# Altium footprint library DRIVER IC.PcbLib: 27 footprints (part 2 of 2)
Each footprint in its own frame and in the unit in brackets; x right, y up, seen from the top. Pads: shape width x height; smd on the part's side, far side on the other; paste and mask are expansions set on the pad; w line width, h text height; cw(c..) or ccw(c..) is an arc to the next point about the centre after c.
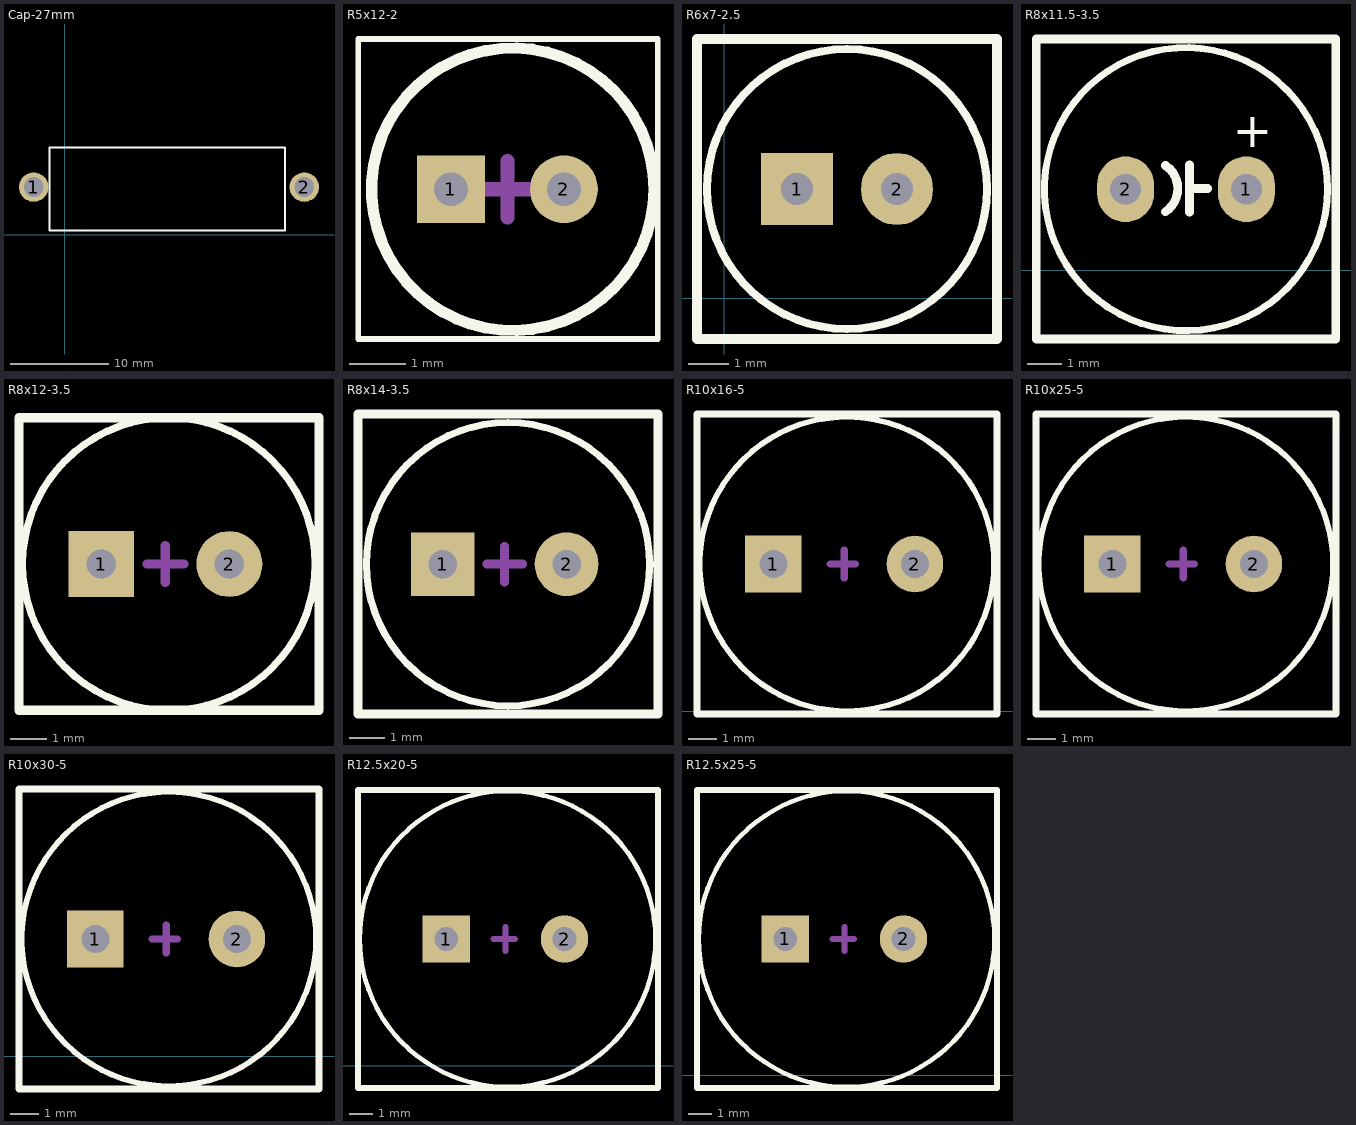
[diagram p1: the footprints below, top view; thin cyan lines are the x and y axes]

## Cap-27mm [mm]
height 16.68
pads (2):
  round 3 hole 2: 1(-3.141,4.874) 2(24.439,4.874)
Top Overlay:
  lines w0.2: -1.541,0.444 -1.541,8.904 22.459,8.904 22.459,0.444 -1.541,0.444
3D body "User Library-Vishay_1uF-400V_MKT_373_STD_27_5pitch.STEP": height 23, standoff -3, extent -4.851,-1.636 26.149,11.364

## R5x12-2 [mm]
height 12
pads (2):
  rect 1.2x1.2 hole 0.6: 1(6.237,4.773)
  round 1.2 hole 0.6: 2(8.237,4.773)
Top Overlay:
  circle w0.2: c7.333,4.773 r2.5
  lines w0.1: 4.597,2.123 4.597,7.433 9.897,7.433 9.897,2.123 4.597,2.123
Mechanical 15:
  lines w0.254: 6.737,4.773 7.737,4.773 ; 7.237,4.273 7.237,5.273
3D body "User Library-CAP-EL5X12_R100_D200_H460.STEP": height 12.2, standoff -2.9, extent 4.697,2.235 9.777,7.311

## R6x7-2.5 [mm]
height 7
pads (2):
  rect 1.8x1.8 hole 0.8: 1(1.818,2.729)
  round 1.8 hole 0.8: 2(4.318,2.729)
Top Overlay:
  circle w0.2: c3.068,2.729 r3.5
  lines w0.254: -0.682,-1.021 -0.682,6.479 6.818,6.479 6.818,-1.021 -0.682,-1.021
3D body "User Library-Cap electrolitic radial 6x7.STEP": height 7.3, standoff -1.2, extent 0.069,-0.27 6.067,5.727

## R8x11.5-3.5 [mil]
pads (2):
  oval 65x75 hole 35: 1(264.13,92.68) 2(126.34,92.68)
Top Overlay:
  circle w7.87: c195.24,92.68 r161.42
  lines w10: 171.6,66.88 ccw(c154.37,93.36) 171.75,119.73 ; 199.17,66.3 199.17,120.63 ; 199.17,93.46 220.04,93.46 ; 24.37,-78.19 24.37,263.94 366.1,263.94 366.1,-78.19 24.37,-78.19
  text "+" at 248.78,140.71 h39.37
3D body "SW3dPS-Cap electro 8x11.5x3.5mm_V2008.STEP": height 473.44, standoff -136.91, extent 35.76,-66.32 352.72,250.64

## R8x12-3.5 [mm]
height 12
pads (2):
  rect 1.8x1.8 hole 0.8: 1(2.878,6.596)
  round 1.8 hole 0.8: 2(6.378,6.596)
Top Overlay:
  circle w0.2: c4.724,6.596 r4
  lines w0.254: 0.628,2.596 0.628,10.596 8.828,10.596 8.828,2.596 0.628,2.596
Mechanical 15:
  lines w0.254: 4.128,6.596 5.128,6.596 ; 4.628,6.096 4.628,7.096
3D body "User Library-Cap-EL(8x12-3_5)T.STEP": height 12.3, standoff -3.3, extent 0.628,2.598 8.63,10.594

## R8x14-3.5 [mm]
height 14
pads (2):
  rect 1.8x1.8 hole 0.8: 1(4.172,4.851)
  round 1.8 hole 0.8: 2(7.672,4.851)
Top Overlay:
  circle w0.2: c6.018,4.851 r4
  lines w0.254: 1.782,0.621 10.252,0.621 10.252,9.091 1.782,9.091 1.782,0.621
Mechanical 15:
  lines w0.254: 5.422,4.851 6.422,4.851 ; 5.922,4.351 5.922,5.351
3D body "User Library-CAP-EL8X14_R150_D320_H570.STEP": height 14.6, standoff -2.7, extent 1.822,0.751 10.022,8.951

## R10x16-5 [mm]
height 16
pads (2):
  rect 2x2 hole 1: 1(5.204,5.199)
  round 2 hole 1: 2(10.204,5.199)
Top Overlay:
  circle w0.2: c7.8,5.199 r5.2
  lines w0.254: 2.504,-0.101 13.104,-0.101 13.104,10.499 2.504,10.499 2.504,-0.101
Mechanical 15:
  lines w0.254: 7.204,5.199 8.104,5.199 ; 7.704,4.699 7.704,5.699
3D body "User Library-Cap-EL(10x16-5).STEP": height 16, standoff -3.3, extent 2.704,0.202 12.706,10.196

## R10x25-5 [mm]
height 25
pads (2):
  rect 2x2 hole 1: 1(5.509,6.764)
  round 2 hole 1: 2(10.509,6.764)
Top Overlay:
  circle w0.2: c8.105,6.764 r5.2
  lines w0.254: 2.809,1.464 2.809,12.064 13.409,12.064 13.409,1.464 2.809,1.464
Mechanical 15:
  lines w0.254: 7.509,6.764 8.409,6.764 ; 8.009,6.264 8.009,7.264
3D body "User Library-Cap-EL(10x25-5).STEP": height 25, standoff -3.3, extent 3.009,1.766 13.011,11.763

## R10x30-5 [mm]
height 30
pads (2):
  rect 2x2 hole 1: 1(4.172,4.146)
  round 2 hole 1: 2(9.172,4.146)
Top Overlay:
  circle w0.2: c6.768,4.146 r5.2
  lines w0.254: 1.472,-1.154 12.072,-1.154 12.072,9.446 1.472,9.446 1.472,-1.154
Mechanical 15:
  lines w0.254: 6.172,4.146 7.072,4.146 ; 6.672,3.646 6.672,4.646
3D body "User Library-Cap-EL(10x30-5)T.STEP": height 30.5, standoff -3.5, extent 1.672,-0.851 11.674,9.142

## R12.5x20-5 [mm]
height 20
pads (2):
  rect 2x2 hole 1: 1(4.491,5.355)
  round 2 hole 1: 2(9.491,5.355)
Top Overlay:
  circle w0.2: c7.087,5.355 r6.25
  lines w0.254: 0.766,-0.945 0.766,11.655 13.441,11.655 13.441,-0.945 0.766,-0.945
Mechanical 15:
  lines w0.254: 6.491,5.355 7.391,5.355 ; 6.991,4.855 6.991,5.855
3D body "User Library-Cap-EL(12_5x20-5)T.STEP": height 20.7, standoff -3.3, extent 0.741,-0.895 13.243,11.605

## R12.5x25-5 [mm]
height 25
pads (2):
  rect 2x2 hole 1: 1(7.143,5.763)
  round 2 hole 1: 2(12.143,5.763)
Top Overlay:
  circle w0.2: c9.739,5.763 r6.25
  lines w0.254: 3.418,-0.537 3.418,12.063 16.093,12.063 16.093,-0.537 3.418,-0.537
Mechanical 15:
  lines w0.254: 9.143,5.763 10.043,5.763 ; 9.643,5.263 9.643,6.263
3D body "User Library-Cap-EL(12_5x25-5)T.STEP": height 25.7, standoff -3.3, extent 3.393,-0.487 15.895,12.013